# Altium footprint library ICs And Semiconductors SMD.PcbLib: 602 footprints (part 9 of 38)
Each footprint in its own frame and in the unit in brackets; x right, y up, seen from the top. Pads: shape width x height; smd on the part's side, far side on the other; paste and mask are expansions set on the pad; w line width, h text height; cw(c..) or ccw(c..) is an arc to the next point about the centre after c.
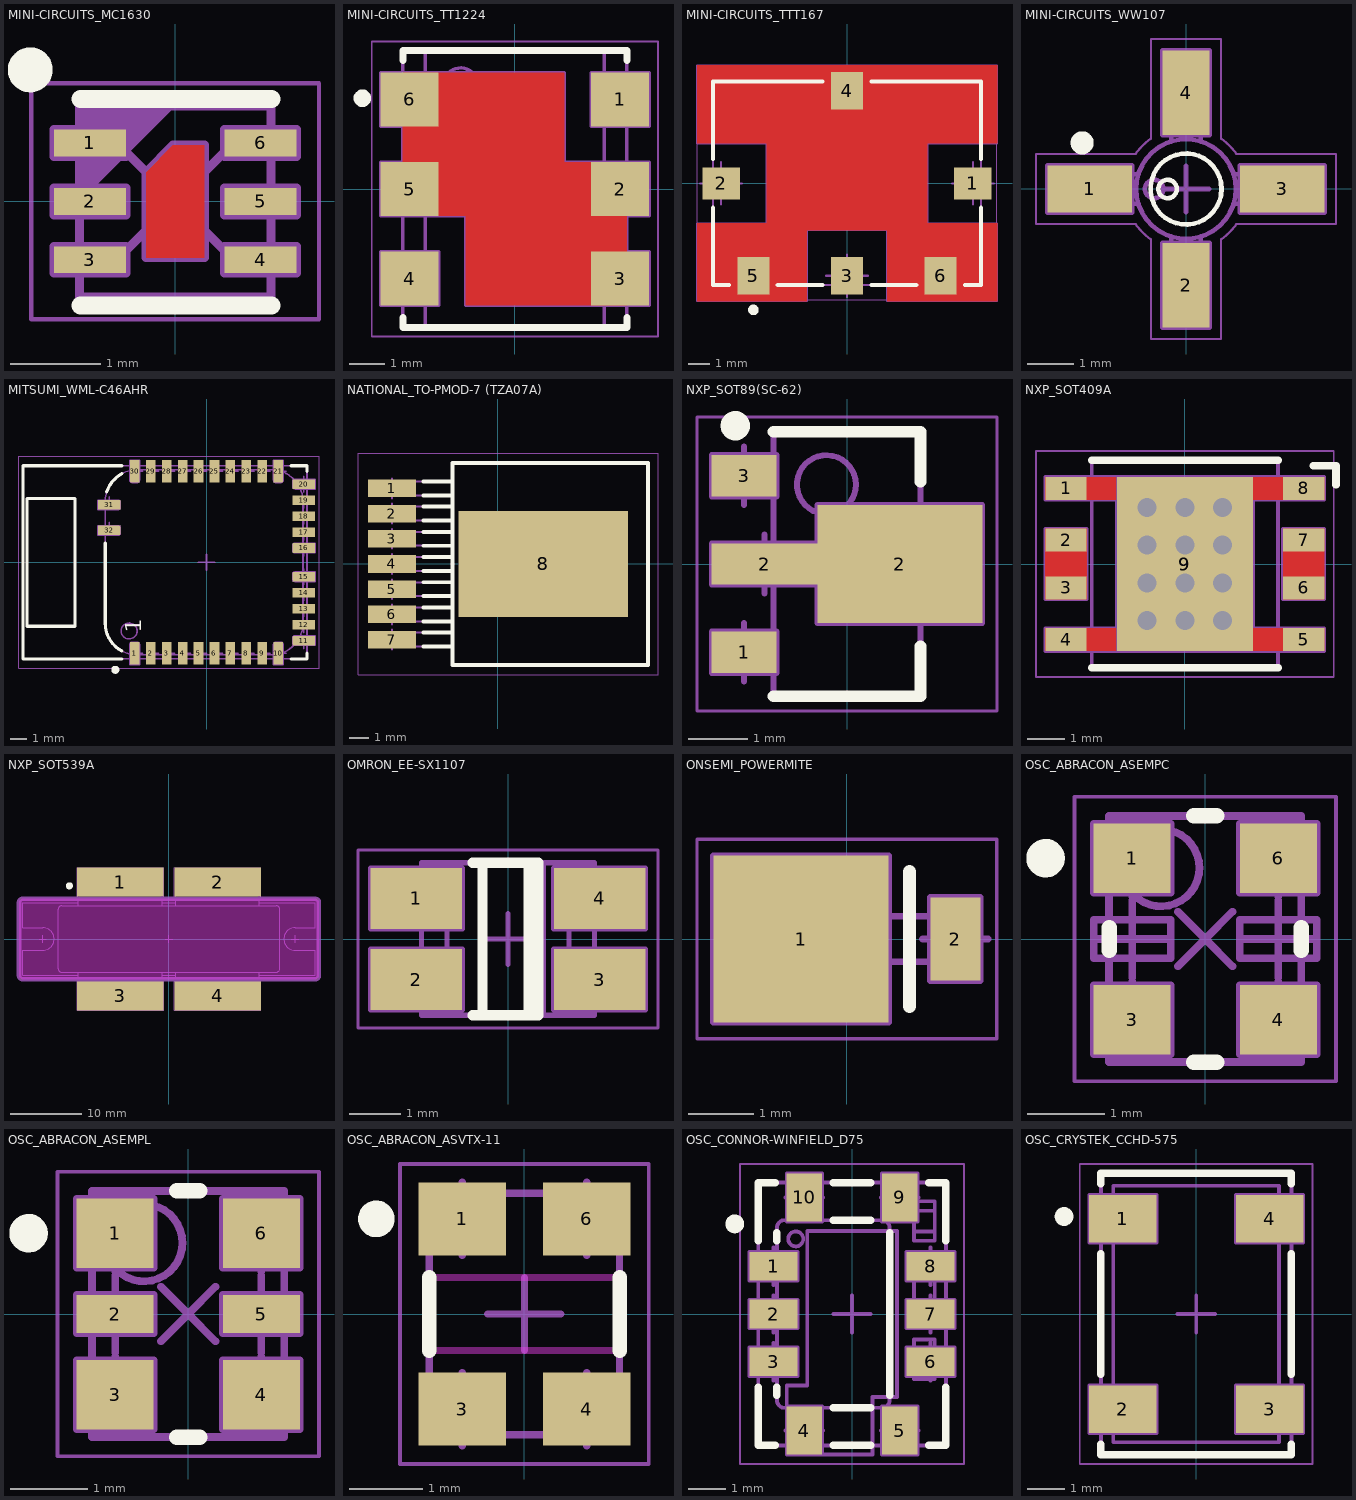
[diagram p8: the footprints below, top view; thin cyan lines are the x and y axes]

## MINI-CIRCUITS_MC1630 [mm] "MINI-CIRCUITS MC1630 Case, 0.65mm pitch, 6 pin, 2mm X 2mm X 0.85mm H body (w/thermal tab 0.65 X 1.25mm)"
height 0.85
pads (6):
  rect 0.8x0.3 smd: 1(-0.95,0.65) 2(-0.95,0) 3(-0.95,-0.65) 4(0.95,-0.65) 5(0.95,0) 6(0.95,0.65)
Top Layer:
  region: -0.325,-0.625 0.325,-0.625 0.325,0.625 -0.025,0.625 -0.325,0.325
Top Overlay:
  circle w0.25: c-1.613,1.463 r0.125
  lines w0.2: -1.054,-1.16 1.074,-1.16 ; -1.054,1.139 1.074,1.139
Mechanical 8:
  lines w0.1: -0.707,-0.707 0,0 ; -0.707,0.707 0,0 ; 0.707,-0.707 0,0 ; 0.707,0.707 0,0 ; -1.35,-0.8 -0.95,-0.65 -1.35,-0.5 ; -1.35,-0.8 -0.55,-0.8 -0.55,-0.5 -1.35,-0.5 ; -1.35,-0.8 -1.35,-0.5 ; -1.35,-0.15 -0.95,0 -1.35,0.15 ; -1.35,-0.15 -0.55,-0.15 -0.55,0.15 -1.35,0.15 ; -1.35,-0.15 -1.35,0.15 ; -1.35,0.5 -0.95,0.65 -1.35,0.8 ; -1.35,0.5 -0.55,0.5 -0.55,0.8 -1.35,0.8 ; -1.35,0.5 -1.35,0.8 ; 1.35,-0.8 0.95,-0.65 1.35,-0.5 ; 1.35,-0.8 0.55,-0.8 0.55,-0.5 1.35,-0.5 ; 1.35,-0.8 1.35,-0.5 ; 1.35,-0.15 0.95,0 1.35,0.15 ; 1.35,-0.15 0.55,-0.15 0.55,0.15 1.35,0.15 ; 1.35,-0.15 1.35,0.15 ; 1.35,0.5 0.95,0.65 1.35,0.8 ; 1.35,0.5 0.55,0.5 0.55,0.8 1.35,0.8 ; 1.35,0.5 1.35,0.8 ; -0.325,-0.625 -0.325,0.325 -0.025,0.625 0.325,0.625 0.325,-0.625 -0.325,-0.625
Mechanical 14:
  lines w0.1: -1.064,0.064 -0.064,1.064 ; -1.064,0.163 -0.163,1.064 ; -1.064,0.263 -0.263,1.064 ; -1.064,0.363 -0.363,1.064 ; -1.064,0.463 -0.463,1.064 ; -1.064,0.563 -0.564,1.064 ; -1.064,0.663 -0.664,1.064 ; -1.064,0.764 -0.764,1.064 ; -1.064,0.864 -0.864,1.064 ; -1.064,0.964 -0.964,1.064 ; -1.064,-1.064 -1.064,1.064 1.064,1.064 1.064,-1.064 -1.064,-1.064
Mechanical 15:
  lines w0.05: -1.6,-1.314 -1.6,1.314 1.6,1.314 1.6,-1.314 -1.6,-1.314
3D body "MINI-CIRCUITS_MC1630.stp": height 0.85, standoff 0, extent -1.063,-1.063 1.064,1.064

## MINI-CIRCUITS_TT1224 [mm] "MINI-CIRCUITS TT1224 Case, 6 pin, 6.35mm W X 7.87mm L"
height 4.06
pads (6):
  rect 1.65x1.52 smd: 1(2.985,2.54) 2(2.985,0) 3(2.985,-2.54) 4(-2.985,-2.54) 5(-2.985,0) 6(-2.985,2.54)
Top Layer:
  region: -3.175,-0.76 -1.395,-0.76 -1.395,-3.3 3.175,-3.3 3.175,0.76 1.395,0.76 1.395,3.3 -3.175,3.3
Top Overlay:
  circle w0.25: c-4.325,2.575 r0.125
  lines w0.2: -3.175,-3.65 -3.175,-3.935 3.175,-3.935 3.175,-3.65 ; -3.175,3.65 -3.175,3.935 3.175,3.935 3.175,3.65
Mechanical 8:
  lines w0.1: -3.485,-2.54 -2.985,-2.54 ; -3.485,0 -2.985,0 ; -3.485,2.54 -2.985,2.54 ; -2.985,-3.04 -2.985,-2.54 ; -2.985,-2.04 -2.985,-2.54 ; -2.985,-0.5 -2.985,0 ; -2.985,0.5 -2.985,0 ; -2.985,2.04 -2.985,2.54 ; -2.985,3.04 -2.985,2.54 ; -2.485,-2.54 -2.985,-2.54 ; -2.485,0 -2.985,0 ; -2.485,2.54 -2.985,2.54 ; -0.5,0 0,0 ; 0,-0.5 0,0 ; 0,0.5 0,0 ; 0.5,0 0,0 ; 2.485,-2.54 2.985,-2.54 ; 2.485,0 2.985,0 ; 2.485,2.54 2.985,2.54 ; 2.985,-3.04 2.985,-2.54 ; 2.985,-2.04 2.985,-2.54 ; 2.985,-0.5 2.985,0 ; 2.985,0.5 2.985,0 ; 2.985,2.04 2.985,2.54 ; 2.985,3.04 2.985,2.54 ; 3.485,-2.54 2.985,-2.54 ; 3.485,0 2.985,0 ; 3.485,2.54 2.985,2.54 ; -3.81,-3.3 -2.16,-3.3 -2.16,-1.78 -3.81,-1.78 -3.81,-3.3 ; -3.81,-0.76 -2.16,-0.76 -2.16,0.76 -3.81,0.76 -3.81,-0.76 ; -3.81,1.78 -2.16,1.78 -2.16,3.3 -3.81,3.3 -3.81,1.78 ; -3.175,-0.76 -3.175,3.3 1.395,3.3 1.395,0.76 3.175,0.76 3.175,-3.3 -1.395,-3.3 -1.395,-0.76 -3.175,-0.76 ; 2.16,-3.3 3.81,-3.3 3.81,-1.78 2.16,-1.78 2.16,-3.3 ; 2.16,-0.76 3.81,-0.76 3.81,0.76 2.16,0.76 2.16,-0.76 ; 2.16,1.78 3.81,1.78 3.81,3.3 2.16,3.3 2.16,1.78
Mechanical 14:
  circle w0.1: c-1.54,2.935 r0.5
  lines w0.1: -2.54,-3.935 -2.54,3.935 ; 2.54,-3.935 2.54,3.935 ; -3.175,-3.935 3.175,-3.935 3.175,-3.09 cw(c3.175,-2.54) 3.175,-1.99 3.175,-0.55 cw(c3.175,0) 3.175,0.55 3.175,1.99 cw(c3.175,2.54) 3.175,3.09 3.175,3.935 -3.175,3.935 -3.175,3.09 cw(c-3.175,2.54) -3.175,1.99 -3.175,0.55 cw(c-3.175,0) -3.175,-0.55 -3.175,-1.99 cw(c-3.175,-2.54) -3.175,-3.09 -3.175,-3.935
Mechanical 15:
  lines w0.05: -4.06,-4.185 -4.06,4.185 4.06,4.185 4.06,-4.185 -4.06,-4.185
3D body "MINI-CIRCUITS_TT1224.stp": height 4.11, standoff 0, extent -3.175,-3.935 3.175,3.935

## MINI-CIRCUITS_TTT167 [mm] "MINI-CIRCUITS TTT167 Case, 6 pin, 9.65mm W X 12.7mm L"
height 5.84
pads (6):
  rect 1.78x1.52 smd: 1(5.97,0) 2(-5.97,0)
  rect 1.52x1.78 smd: 3(0,-4.38) 4(0,4.38) 5(-4.44,-4.38) 6(4.44,-4.38)
Top Layer:
  region: -7.112,-1.903 -3.81,-1.903 -3.81,1.903 -7.112,1.903 -7.112,5.588 7.112,5.588 7.112,1.903 3.81,1.903 3.81,-1.903 7.112,-1.903 7.112,-5.588 1.903,-5.588 1.903,-2.22 -1.903,-2.22 -1.903,-5.588 -7.112,-5.588
Top Overlay:
  circle w0.25: c-4.44,-6 r0.125
  lines w0.2: -6.35,-1.16 -6.35,-4.825 -5.6,-4.825 ; -6.35,1.16 -6.35,4.825 -1.16,4.825 ; -3.28,-4.825 -1.16,-4.825 ; 1.16,-4.825 3.28,-4.825 ; 1.16,4.825 6.35,4.825 6.35,1.16 ; 5.6,-4.825 6.35,-4.825 6.35,-1.16
Mechanical 8:
  lines w0.1: -6.97,0 -5.97,0 ; -5.97,-1 -5.97,0 ; -5.97,1 -5.97,0 ; -5.44,-4.38 -4.44,-4.38 ; -4.97,0 -5.97,0 ; -4.44,-5.38 -4.44,-4.38 ; -4.44,-3.38 -4.44,-4.38 ; -3.44,-4.38 -4.44,-4.38 ; -1,-4.38 0,-4.38 ; -1,0 0,0 ; -1,4.38 0,4.38 ; 0,-5.38 0,-4.38 ; 0,-3.38 0,-4.38 ; 0,-1 0,0 ; 0,1 0,0 ; 0,3.38 0,4.38 ; 0,5.38 0,4.38 ; 1,-4.38 0,-4.38 ; 1,0 0,0 ; 1,4.38 0,4.38 ; 3.44,-4.38 4.44,-4.38 ; 4.44,-5.38 4.44,-4.38 ; 4.44,-3.38 4.44,-4.38 ; 4.97,0 5.97,0 ; 5.44,-4.38 4.44,-4.38 ; 5.97,-1 5.97,0 ; 5.97,1 5.97,0 ; 6.97,0 5.97,0 ; -7.112,-5.588 -1.903,-5.588 -1.903,-2.22 1.903,-2.22 1.903,-5.588 7.112,-5.588 7.112,-1.903 3.81,-1.903 3.81,1.903 7.112,1.903 7.112,5.588 -7.112,5.588 -7.112,1.903 -3.81,1.903 -3.81,-1.903 -7.112,-1.903 -7.112,-5.588
Mechanical 14:
  circle w0.1: c-4.44,-3 r0.4
  lines w0.1: -6.35,-4.825 -4.99,-4.825 cw(c-4.44,-4.825) -3.89,-4.825 -0.55,-4.825 cw(c0,-4.825) 0.55,-4.825 3.89,-4.825 cw(c4.44,-4.825) 4.99,-4.825 6.35,-4.825 6.35,-0.55 cw(c6.35,0) 6.35,0.55 6.35,4.825 0.55,4.825 cw(c0,4.825) -0.55,4.825 -6.35,4.825 -6.35,0.55 cw(c-6.35,0) -6.35,-0.55 -6.35,-4.825
Mechanical 15:
  lines w0.05: -7.11,-5.52 7.11,-5.52 7.11,5.52 -7.11,5.52 -7.11,-5.52
3D body "MINI-CIRCUITS_TTT167.stp": height 5.84, standoff 0, extent -6.35,-4.825 6.35,4.825

## MINI-CIRCUITS_WW107 [mm] "MINI-CIRCUITS WW107 Case"
height 1.52
pads (4):
  rect 1.83x1.02 smd: 1(-2.085,0) 3(2.085,0)
  rect 1.02x1.83 smd: 2(0,-2.085) 4(0,2.085)
Top Overlay:
  circle w0.25: c-2.25,1 r0.125
  circle w0.1: c0,0 r0.77
  circle w0.1: c-0.4,0 r0.2
Mechanical 8:
  lines w0.1: -2.585,0 -2.085,0 ; -2.085,-0.5 -2.085,0 ; -2.085,0.5 -2.085,0 ; -1.585,0 -2.085,0 ; -0.5,-2.085 0,-2.085 ; -0.5,0 0,0 ; -0.5,2.085 0,2.085 ; 0,-2.585 0,-2.085 ; 0,-1.585 0,-2.085 ; 0,-0.5 0,0 ; 0,0.5 0,0 ; 0,1.585 0,2.085 ; 0,2.585 0,2.085 ; 0.5,-2.085 0,-2.085 ; 0.5,0 0,0 ; 0.5,2.085 0,2.085 ; 1.585,0 2.085,0 ; 2.085,-0.5 2.085,0 ; 2.085,0.5 2.085,0 ; 2.585,0 2.085,0 ; -3,-0.51 -1.17,-0.51 -1.17,0.51 -3,0.51 -3,-0.51 ; -0.51,-3 0.51,-3 0.51,-1.17 -0.51,-1.17 -0.51,-3 ; -0.51,1.17 0.51,1.17 0.51,3 -0.51,3 -0.51,1.17 ; 1.17,-0.51 3,-0.51 3,0.51 1.17,0.51 1.17,-0.51
Mechanical 14:
  circle w0.1: c-0.691,0 r0.2
  circle w0.1: c0,0 r1.08
  lines w0.1: -1.029,-0.318 -2.84,-0.318 -2.84,-0.182 -2.34,0.318 -1.029,0.318 ; -0.318,-1.029 -0.318,-2.54 0.318,-2.54 0.318,-1.029 ; -0.318,1.029 -0.318,2.54 0.318,2.54 0.318,1.029 ; 1.029,-0.318 2.54,-0.318 2.54,0.318 1.029,0.318
Mechanical 15:
  lines w0.05: -3.25,-0.76 -3.25,0.76 -1.091,0.76 cw(c0,0) -0.76,1.091 -0.76,3.25 0.76,3.25 0.76,1.091 cw(c0,0) 1.091,0.76 3.25,0.76 3.25,-0.76 1.091,-0.76 cw(c0,0) 0.76,-1.092 0.76,-3.25 -0.76,-3.25 -0.76,-1.092 cw(c0,0) -1.091,-0.76 -3.25,-0.76
3D body "MINI-CIRCUITS_WW107.stp": height 1.52, standoff 0, extent -2.84,-2.54 2.54,2.54

## MITSUMI_WML-C46AHR [mm] "QFP,0.80mm Pitch, Square; 32 Pin, 7.00mm L X 7.00mm W X 1.60mm H Body, IPC Medium Density"
height 1.6
pads (32):
  rect 0.6x1.4 smd: 1(-4.5,-5.7) 2(-3.5,-5.7) 3(-2.5,-5.7) 4(-1.5,-5.7) 5(-0.5,-5.7) 6(0.5,-5.7) 7(1.5,-5.7) 8(2.5,-5.7) 9(3.5,-5.7) 10(4.5,-5.7) 21(4.5,5.7) 22(3.5,5.7) 23(2.5,5.7) 24(1.5,5.7) 25(0.5,5.7) 26(-0.5,5.7) 27(-1.5,5.7) 28(-2.5,5.7) 29(-3.5,5.7) 30(-4.5,5.7)
  rect 1.4x0.6 smd: 11(6.1,-4.9) 12(6.1,-3.9) 13(6.1,-2.9) 14(6.1,-1.9) 15(6.1,-0.9) 16(6.1,0.9) 17(6.1,1.9) 18(6.1,2.9) 19(6.1,3.9) 20(6.1,4.9) 31(-6.1,3.6) 32(-6.1,2)
Top Overlay:
  circle w0.25: c-5.715,-6.731 r0.125
  lines w0.2: -6.35,1.2 -6.35,-3.8 ccw(c-4.35,-3.8) -5.3,-5.56 ; -6.258,4.4 cw(c-4.35,3.8) -5.3,5.56 ; -5.3,-6.05 -11.5,-6.05 -11.5,6.05 -5.3,6.05 ; 5.3,-6.05 6.3,-6.05 6.3,-5.7 ; 5.3,6.05 6.3,6.05 6.3,5.7 ; -11.25,-4 -11.25,4 -8.25,4 -8.25,-4 -11.25,-4
  text "1" at -4.075,-4.425 h1
Mechanical 8:
  drawing of 162 lines, arcs and shapes, not listed
  text "16" at 4.445,0.635 h0.5
  text "15" at 4.445,-1.143 h0.5
  text "32" at -5.08,1.778 h0.5
  text "31" at -5.08,3.302 h0.5
  text "21" at 4.191,4.318 h0.5
  text "30" at -4.826,4.191 h0.5
  text "10" at 4.699,-4.699 h0.5
Mechanical 14:
  circle w0.1: c-4.85,-4.3 r0.5
  lines w0.1: -11.5,-6.05 6.3,-6.05 6.3,6.05 -11.5,6.05 -11.5,-6.05 ; -11.25,-4 -11.25,4 -8.25,4 -8.25,-4 -11.25,-4 ; -6.35,-3.8 ccw(c-4.35,-3.8) -4.35,-5.8 4.05,-5.8 ccw(c4.05,-3.8) 6.05,-3.8 6.05,3.8 ccw(c4.05,3.8) 4.05,5.8 -4.35,5.8 ccw(c-4.35,3.8) -6.35,3.8 -6.35,-3.8
Mechanical 15:
  lines w0.05: -11.75,-6.65 7.05,-6.65 7.05,6.65 -11.75,6.65 -11.75,-6.65
3D body "MITSUMI_WML-C46AHR.stp": height 2, standoff 0, extent -11.5,-6.05 6.3,6.05

## NATIONAL_TO-PMOD-7 (TZA07A) [mm] "TO-PMOD 7 Pin Package, NATIONAL Package TZA07A, 1.70mm pitch; 9.85mm L X 10.16mm W X 4.67mm H body"
height 4.67
pads (8):
  rect 2.41x0.89 smd: 1(-5.339,3.81) 2(-5.339,2.54) 3(-5.339,1.27) 4(-5.339,0) 5(-5.339,-1.27) 6(-5.339,-2.54) 7(-5.339,-3.81)
  rect 8.54x5.35 smd: 8(2.291,0)
Top Overlay:
  lines w0.2: -3.734,-4.16 -2.279,-4.16 ; -3.734,-3.46 -2.279,-3.46 ; -3.734,-2.89 -2.279,-2.89 ; -3.734,-2.19 -2.279,-2.19 ; -3.734,-1.62 -2.279,-1.62 ; -3.734,-0.92 -2.279,-0.92 ; -3.734,-0.35 -2.279,-0.35 ; -3.734,0.35 -2.279,0.35 ; -3.734,0.92 -2.279,0.92 ; -3.734,1.62 -2.279,1.62 ; -3.734,2.19 -2.279,2.19 ; -3.734,2.89 -2.279,2.89 ; -3.734,3.46 -2.279,3.46 ; -3.734,4.16 -2.279,4.16 ; -2.279,-5.08 7.571,-5.08 7.571,5.08 -2.279,5.08 -2.279,-5.08
Mechanical 8:
  lines w0.1: -5.839,-3.81 -5.339,-3.81 ; -5.839,-2.54 -5.339,-2.54 ; -5.839,-1.27 -5.339,-1.27 ; -5.839,0 -5.339,0 ; -5.839,1.27 -5.339,1.27 ; -5.839,2.54 -5.339,2.54 ; -5.839,3.81 -5.339,3.81 ; -5.339,-4.31 -5.339,-3.81 ; -5.339,-3.31 -5.339,-3.81 ; -5.339,-3.04 -5.339,-2.54 ; -5.339,-2.04 -5.339,-2.54 ; -5.339,-1.77 -5.339,-1.27 ; -5.339,-0.77 -5.339,-1.27 ; -5.339,-0.5 -5.339,0 ; -5.339,0.5 -5.339,0 ; -5.339,0.77 -5.339,1.27 ; -5.339,1.77 -5.339,1.27 ; -5.339,2.04 -5.339,2.54 ; -5.339,3.04 -5.339,2.54 ; -5.339,3.31 -5.339,3.81 ; -5.339,4.31 -5.339,3.81 ; -4.839,-3.81 -5.339,-3.81 ; -4.839,-2.54 -5.339,-2.54 ; -4.839,-1.27 -5.339,-1.27 ; -4.839,0 -5.339,0 ; -4.839,1.27 -5.339,1.27 ; -4.839,2.54 -5.339,2.54 ; -4.839,3.81 -5.339,3.81 ; 1.791,0 2.291,0 ; 2.291,-0.5 2.291,0 ; 2.291,0.5 2.291,0 ; 2.791,0 2.291,0
Mechanical 14:
  lines w0.1: -2.279,-4.16 -6.199,-4.16 -6.199,-3.46 -2.279,-3.46 ; -2.279,-2.89 -6.199,-2.89 -6.199,-2.19 -2.279,-2.19 ; -2.279,-1.62 -6.199,-1.62 -6.199,-0.92 -2.279,-0.92 ; -2.279,-0.35 -6.199,-0.35 -6.199,0.35 -2.279,0.35 ; -2.279,0.92 -6.199,0.92 -6.199,1.62 -2.279,1.62 ; -2.279,2.19 -6.199,2.19 -6.199,2.89 -2.279,2.89 ; -2.279,3.46 -6.199,3.46 -6.199,4.16 -2.279,4.16 ; -2.279,-5.08 7.571,-5.08 7.571,5.08 -2.279,5.08 -2.279,-5.08
Mechanical 15:
  lines w0.05: -0.5,0 0,0 ; 0,-0.5 0,0 ; 0,0.5 0,0 ; 0.5,0 0,0 ; -7.044,-5.58 8.071,-5.58 8.071,5.58 -7.044,5.58 -7.044,-5.58
3D body "NATIONAL_TO-PMOD-7 (TZA07A).stp": height 4.77, standoff 0, extent -6.199,-5.08 7.571,5.08

## NXP_SOT89(SC-62) [mm] "SOT89, (SC-62), TO-243, 3-Leads, Body 2.5x4.5mm"
height 1.2
pads (4):
  rect 1.1x0.7 smd: 1(-1.75,-1.5) 3(-1.75,1.5)
  rect 1.8x0.7 smd: 2(-1.4,0)
  rect 2.8x2 smd: 2(0.9,0)
Top Overlay:
  circle w0.25: c-1.9,2.35 r0.125
  lines w0.2: -1.25,-2.25 1.25,-2.25 1.25,-1.4 ; -1.25,2.25 1.25,2.25 1.25,1.4
Mechanical 8:
  lines w0.1: -2.25,-1.5 -1.75,-1.5 ; -2.25,1.5 -1.75,1.5 ; -1.9,0 -1.4,0 ; -1.75,-2 -1.75,-1.5 ; -1.75,-1 -1.75,-1.5 ; -1.75,1 -1.75,1.5 ; -1.75,2 -1.75,1.5 ; -1.4,-0.5 -1.4,0 ; -1.4,0.5 -1.4,0 ; -1.25,-1.5 -1.75,-1.5 ; -1.25,1.5 -1.75,1.5 ; -0.9,0 -1.4,0 ; -0.5,0 0,0 ; 0,-0.5 0,0 ; 0,0.5 0,0 ; 0.4,0 0.9,0 ; 0.5,0 0,0 ; 0.9,-0.5 0.9,0 ; 0.9,0.5 0.9,0 ; 1.4,0 0.9,0 ; -2.3,-1.85 -1.2,-1.85 -1.2,-1.15 -2.3,-1.15 -2.3,-1.85 ; -2.3,-0.35 -0.5,-0.35 -0.5,-1 2.3,-1 2.3,1 -0.5,1 -0.5,0.35 -2.3,0.35 -2.3,-0.35 ; -2.3,1.15 -1.2,1.15 -1.2,1.85 -2.3,1.85 -2.3,1.15
Mechanical 14:
  circle w0.1: c-0.35,1.35 r0.5
  lines w0.1: -1.25,-1.707 -1.25,-1.293 ; -1.25,1.293 -1.25,1.707 ; -1.25,-2.25 -1.25,2.25 1.25,2.25 1.25,-2.25 -1.25,-2.25
Mechanical 15:
  lines w0.05: -2.55,-2.5 -2.55,2.5 2.55,2.5 2.55,-2.5 -2.55,-2.5
3D body "NXP_SOT89(SC-62).stp": height 1.6, standoff 0, extent -2.25,-2.25 2.25,2.25

## NXP_SOT409A [mm] "SOT409A, 1.27mm pitch; 8 pin, 4.47mm W X 5.485mm L X 2.36mm H body (w/thermal tab 3.6mm X 4.6mm)"
height 2.36
pads (10):
  rect 1.09x0.6 smd: 1(-3.145,2) 2(-3.145,0.635) 3(-3.145,-0.635) 4(-3.145,-2) 5(3.145,-2) 6(3.145,-0.635) 7(3.145,0.635) 8(3.145,2)
  rect 3.6x4.6 smd: 9(0,0)
  rect 3.6x4.6 smd far side paste-3.61: 9(0,0)
via -1,1.5 diameter 0.8 hole 0.5
via 0,1.5 diameter 0.8 hole 0.5
via 1,1.5 diameter 0.8 hole 0.5
via 1,0.5 diameter 0.8 hole 0.5
via 0,0.5 diameter 0.8 hole 0.5
via -1,0.5 diameter 0.8 hole 0.5
via -1,-0.5 diameter 0.8 hole 0.5
via 0,-0.5 diameter 0.8 hole 0.5
via 1,-0.5 diameter 0.8 hole 0.5
via -1,-1.5 diameter 0.8 hole 0.5
via 0,-1.5 diameter 0.8 hole 0.5
via 1,-1.5 diameter 0.8 hole 0.5
Top Layer:
  region: -3.69,-2.3 -3.69,-1.7 -1.8,-1.7 -1.8,1.7 -3.69,1.7 -3.69,2.3 3.69,2.3 3.69,1.7 1.8,1.7 1.8,-1.7 3.69,-1.7 3.69,-2.3
  region: -3.69,0.935 -2.6,0.935 -2.6,-0.935 -3.69,-0.935
  region: 2.6,0.935 3.69,0.935 3.69,-0.935 2.6,-0.935
Top Overlay:
  lines w0.2: -2.465,-2.743 2.465,-2.743 ; -2.465,2.743 2.465,2.743 ; 3.4,2.6 4,2.6 4,2.1
Top Paste:
  region: -1.06,-1.81 1.06,-1.81 1.06,-0.25 -1.06,-0.25
  region: -1.06,0.25 1.06,0.25 1.06,1.81 -1.06,1.81
Mechanical 8:
  lines w0.1: -3.445,-2 -3.145,-2 ; -3.445,-0.635 -3.145,-0.635 ; -3.445,0.635 -3.145,0.635 ; -3.445,2 -3.145,2 ; -3.145,-2.3 -3.145,-2 ; -3.145,-1.7 -3.145,-2 ; -3.145,-0.935 -3.145,-0.635 ; -3.145,-0.335 -3.145,-0.635 ; -3.145,0.335 -3.145,0.635 ; -3.145,0.935 -3.145,0.635 ; -3.145,1.7 -3.145,2 ; -3.145,2.3 -3.145,2 ; -2.845,-2 -3.145,-2 ; -2.845,-0.635 -3.145,-0.635 ; -2.845,0.635 -3.145,0.635 ; -2.845,2 -3.145,2 ; -1.3,-1.5 -1,-1.5 ; -1.3,-0.5 -1,-0.5 ; -1.3,0.5 -1,0.5 ; -1.3,1.5 -1,1.5 ; -1,-1.8 -1,-1.5 ; -1,-1.2 -1,-1.5 ; -1,-0.8 -1,-0.5 ; -1,-0.2 -1,-0.5 ; -1,0.2 -1,0.5 ; -1,0.8 -1,0.5 ; -1,1.2 -1,1.5 ; -1,1.8 -1,1.5 ; -0.7,-1.5 -1,-1.5 ; -0.7,-0.5 -1,-0.5 ; -0.7,0.5 -1,0.5 ; -0.7,1.5 -1,1.5 ; -0.3,-1.5 0,-1.5 ; -0.3,-0.5 0,-0.5 ; -0.3,0 0,0 ; -0.3,0.5 0,0.5 ; -0.3,1.5 0,1.5 ; 0,-1.8 0,-1.5 ; 0,-1.2 0,-1.5 ; 0,-0.8 0,-0.5 ; 0,-0.3 0,0 ; 0,-0.2 0,-0.5 ; 0,0.2 0,0.5 ; 0,0.3 0,0 ; 0,0.8 0,0.5 ; 0,1.2 0,1.5 ; 0,1.8 0,1.5 ; 0.3,-1.5 0,-1.5 ; 0.3,-0.5 0,-0.5 ; 0.3,0 0,0 ; 0.3,0.5 0,0.5 ; 0.3,1.5 0,1.5 ; 0.7,-1.5 1,-1.5 ; 0.7,-0.5 1,-0.5 ; 0.7,0.5 1,0.5 ; 0.7,1.5 1,1.5 ; 1,-1.8 1,-1.5 ; 1,-1.2 1,-1.5 ; 1,-0.8 1,-0.5 ; 1,-0.2 1,-0.5 ; 1,0.2 1,0.5 ; 1,0.8 1,0.5 ; 1,1.2 1,1.5 ; 1,1.8 1,1.5 ; 1.3,-1.5 1,-1.5 ; 1.3,-0.5 1,-0.5 ; 1.3,0.5 1,0.5 ; 1.3,1.5 1,1.5 ; 2.845,-2 3.145,-2 ; 2.845,-0.635 3.145,-0.635 ; 2.845,0.635 3.145,0.635 ; 2.845,2 3.145,2 ; 3.145,-2.3 3.145,-2 ; 3.145,-1.7 3.145,-2 ; 3.145,-0.935 3.145,-0.635 ; 3.145,-0.335 3.145,-0.635 ; 3.145,0.335 3.145,0.635 ; 3.145,0.935 3.145,0.635 ; 3.145,1.7 3.145,2 ; 3.145,2.3 3.145,2 ; 3.445,-2 3.145,-2 ; 3.445,-0.635 3.145,-0.635 ; 3.445,0.635 3.145,0.635 ; 3.445,2 3.145,2 ; -3.69,-2.3 -3.69,-1.7 -1.8,-1.7 -1.8,1.7 -3.69,1.7 -3.69,2.3 3.69,2.3 3.69,1.7 1.8,1.7 1.8,-1.7 3.69,-1.7 3.69,-2.3 -3.69,-2.3 ; -3.69,-0.935 -2.6,-0.935 -2.6,0.935 -3.69,0.935 -3.69,-0.935 ; 2.6,-0.935 3.69,-0.935 3.69,0.935 2.6,0.935 2.6,-0.935
Mechanical 14:
  lines w0.1: 3.381,2.3 3.69,1.991 ; 3.523,2.3 3.69,2.133 ; 3.664,2.3 3.69,2.274 ; -2.465,-2.743 -2.465,2.743 2.465,2.743 2.465,-2.743 -2.465,-2.743 ; 3.24,2.3 3.69,2.3 3.69,1.85 3.24,2.3
Mechanical 15:
  circle w0.05: c0,0 r0.35
  lines w0.05: -0.5,0 0.5,0 ; 0,-0.5 0,0.5 ; -3.94,-2.993 3.94,-2.993 3.94,2.993 -3.94,2.993 -3.94,-2.993
Drill Drawing:
  lines w0.1: -1.8,-2.3 1.8,-2.3 1.8,2.3 -1.8,2.3 -1.8,-2.3
  text "Filled and" at -3.075,-2.725 h0.6
  text "Capped Via" at -2.1,-2.725 h0.6
3D body "NXP_SOT409A.stp": height 2.36, standoff 0, extent -3.682,-2.742 3.683,2.743

## NXP_SOT539A [mm] "SOT539A Flanged balanced LDMOST ceramic package; 2 mounting holes; 4 leads"
height 5.33
pads (4):
  rect 12.2x4.1 smd: 1(-6.86,8.018) 2(6.86,8.018) 3(-6.86,-8.018) 4(6.86,-8.018)
Top Overlay:
  circle w0.5: c-14.05,7.5 r0.25
Keep-Out Layer:
  board cut-out: -20.64,-5.65 -20.74,-5.65 -20.923,-5.574 -21.064,-5.433 -21.14,-5.249 -21.14,-5.15 -21.14,5.15 -21.14,5.249 -21.064,5.433 -20.923,5.574 -20.74,5.65 -20.64,5.65 20.66,5.65 20.759,5.65 20.943,5.574 21.084,5.433 21.16,5.249 21.16,5.15 21.16,-5.15 21.16,-5.249 21.084,-5.433 20.943,-5.574 20.759,-5.65 20.66,-5.65
Mechanical 1:
  lines w0.635: -21.15,-5.15 ccw(c-20.65,-5.15) -20.65,-5.65 20.65,-5.65 ccw(c20.65,-5.15) 21.15,-5.15 21.15,5.15 ccw(c20.65,5.15) 20.65,5.65 -20.65,5.65 ccw(c-20.65,5.15) -21.15,5.15 -21.15,-5.15
Mechanical 8:
  lines w0.1: -18.28,0 -17.78,0 ; -17.78,-0.5 -17.78,0 ; -17.78,0.5 -17.78,0 ; -17.28,0 -17.78,0 ; -7.36,-8.018 -6.86,-8.018 ; -7.36,8.018 -6.86,8.018 ; -6.86,-8.518 -6.86,-8.018 ; -6.86,-7.518 -6.86,-8.018 ; -6.86,7.518 -6.86,8.018 ; -6.86,8.518 -6.86,8.018 ; -6.36,-8.018 -6.86,-8.018 ; -6.36,8.018 -6.86,8.018 ; -0.5,0 0,0 ; 0,-0.5 0,0 ; 0,0.5 0,0 ; 0.5,0 0,0 ; 6.36,-8.018 6.86,-8.018 ; 6.36,8.018 6.86,8.018 ; 6.86,-8.518 6.86,-8.018 ; 6.86,-7.518 6.86,-8.018 ; 6.86,7.518 6.86,8.018 ; 6.86,8.518 6.86,8.018 ; 7.36,-8.018 6.86,-8.018 ; 7.36,8.018 6.86,8.018 ; 17.28,0 17.78,0 ; 17.78,-0.5 17.78,0 ; 17.78,0.5 17.78,0 ; 18.28,0 17.78,0 ; -12.96,-10.068 -12.96,-5.968 -0.76,-5.968 -0.76,-10.068 -12.96,-10.068 ; -12.96,5.968 -0.76,5.968 -0.76,10.068 -12.96,10.068 -12.96,5.968 ; 0.76,-10.068 0.76,-5.968 12.96,-5.968 12.96,-10.068 0.76,-10.068 ; 0.76,5.968 12.96,5.968 12.96,10.068 0.76,10.068 0.76,5.968
Mechanical 14:
  lines w0.1: -12.765,-5.145 -20.64,-5.145 -20.64,-1.587 -17.78,-1.587 ccw(c-17.78,0) -17.78,1.587 -20.64,1.587 -20.64,5.145 -12.765,5.145 ; -0.955,-5.145 0.955,-5.145 ; -0.955,5.145 0.955,5.145 ; 12.765,-5.145 20.64,-5.145 20.64,-1.587 17.78,-1.587 cw(c17.78,0) 17.78,1.587 20.64,1.587 20.64,5.145 12.765,5.145 ; -15.623,-4.2 ccw(c-15.123,-4.2) -15.123,-4.7 15.123,-4.7 ccw(c15.123,-4.2) 15.623,-4.2 15.623,4.2 ccw(c15.123,4.2) 15.123,4.7 -15.123,4.7 ccw(c-15.123,4.2) -15.623,4.2 -15.623,-4.2 ; -12.765,-8.56 -12.765,-4.7 -0.955,-4.7 -0.955,-8.56 -12.765,-8.56 ; -12.765,4.7 -12.765,7.36 -11.565,8.56 -0.955,8.56 -0.955,4.7 -12.765,4.7 ; 0.955,-8.56 12.765,-8.56 12.765,-4.7 0.955,-4.7 0.955,-8.56 ; 0.955,4.7 12.765,4.7 12.765,8.56 2.155,8.56 0.955,7.36 0.955,4.7
Drill Drawing:
  lines w0.1: -20.21,2.598 -21.15,2.94 ; -20.21,3.282 -21.15,2.94 ; -18.772,-4.71 -18.43,-5.65 ; -18.772,4.71 -18.43,5.65 ; -18.088,-4.71 -18.43,-5.65 ; -18.088,4.71 -18.43,5.65 ; -0.5,0 0,0 ; 0,-0.5 0,0 ; 0,0.5 0,0 ; 0.5,0 0,0 ; 14.819,-4.052 19.552,-4.052 21.004,-5.504 ; 20.097,-5.081 21.004,-5.504 ; 20.21,2.598 21.15,2.94 ; 20.21,3.282 21.15,2.94 ; 20.581,-4.597 21.004,-5.504 ; -21.15,2.94 21.15,2.94 ; -18.43,-5.65 -18.43,5.65 ; -21.15,-5.15 ccw(c-20.65,-5.15) -20.65,-5.65 20.65,-5.65 ccw(c20.65,-5.15) 21.15,-5.15 21.15,5.15 ccw(c20.65,5.15) 20.65,5.65 -20.65,5.65 ccw(c-20.65,5.15) -21.15,5.15 -21.15,-5.15
  text "r0.5" at 14.748,-3.843 h1
  text "11.3" at -18.639,-1.021 h1
  text "42.3" at -4.271,3.149 h1
3D body "NXP_SOT539A.stp": height 3.03, standoff -2.3, extent -20.64,-8.56 20.64,8.56

## OMRON_EE-SX1107 [mm] "OMRON 3.4mm x 3mm x 3mm Photomicrosensor"
height 3.15
pads (4):
  rect 1.8x1.2 smd: 1(-1.8,0.8) 2(-1.8,-0.8) 3(1.8,-0.8) 4(1.8,0.8)
Top Overlay:
  lines w0.2: -0.7,-1.5 0.6,-1.5 0.6,1.5 -0.7,1.5 ; -0.5,-1.5 -0.5,1.5 ; 0.4,-1.5 0.4,1.5 ; 0.5,-1.5 0.5,1.5 0.5,-1.5
Mechanical 8:
  lines w0.1: -2.3,-0.8 -1.8,-0.8 ; -2.3,0.8 -1.8,0.8 ; -1.8,-1.3 -1.8,-0.8 ; -1.8,-0.3 -1.8,-0.8 ; -1.8,0.3 -1.8,0.8 ; -1.8,1.3 -1.8,0.8 ; -1.3,-0.8 -1.8,-0.8 ; -1.3,0.8 -1.8,0.8 ; -0.5,0 0,0 ; 0,-0.5 0,0 ; 0,0.5 0,0 ; 0.5,0 0,0 ; 1.3,-0.8 1.8,-0.8 ; 1.3,0.8 1.8,0.8 ; 1.8,-1.3 1.8,-0.8 ; 1.8,-0.3 1.8,-0.8 ; 1.8,0.3 1.8,0.8 ; 1.8,1.3 1.8,0.8 ; 2.3,-0.8 1.8,-0.8 ; 2.3,0.8 1.8,0.8 ; -2.7,-1.4 -2.7,-0.2 -0.9,-0.2 -0.9,-1.4 -2.7,-1.4 ; -2.7,0.2 -0.9,0.2 -0.9,1.4 -2.7,1.4 -2.7,0.2 ; 0.9,-1.4 2.7,-1.4 2.7,-0.2 0.9,-0.2 0.9,-1.4 ; 0.9,0.2 2.7,0.2 2.7,1.4 0.9,1.4 0.9,0.2
Mechanical 14:
  lines w0.1: -1.2,-1.5 -1.2,1.5 ; -0.5,-1.5 -0.5,1.5 ; 0.5,-1.5 0.5,1.5 ; 0.6,-1.5 0.6,1.5 ; 0.65,-1.5 0.65,1.5 ; 0.7,-1.5 0.7,1.5 ; 1.2,-1.5 1.2,1.5 ; -1.7,-1.5 -1.7,1.5 1.7,1.5 1.7,-1.5 -1.7,-1.5
  text "E" at 2,-1.2 h0.8
  text "C" at 2,0.4 h0.8
  text "K" at -2.5,-1.2 h0.8
  text "A" at -2.5,0.4 h0.8
Mechanical 15:
  lines w0.05: -2.95,-1.75 2.95,-1.75 2.95,1.75 -2.95,1.75 -2.95,-1.75
3D body "OMRON_EE-SX1107.stp": height 3, standoff 0, extent -1.7,-1.5 1.7,1.5

## ONSEMI_POWERMITE [mil] "ON SEMICONDUCTOR POWERMITE Case, 2-Leads, Body 1.965 x 1.9mm"
height 45.28
pads (2):
  rect 105.12x100 smd: 1(-27.5,0)
  rect 30x50 smd: 2(65.06,0)
Top Overlay:
  lines w7.87: 37.56,-40.35 37.56,40.35
Mechanical 8:
  lines w3.94: -47.19,0 -27.5,0 ; -27.5,-19.68 -27.5,0 ; -27.5,19.69 -27.5,0 ; -19.68,0 0,0 ; 0,-19.69 0,0 ; 0,19.69 0,0 ; 19.69,0 0,0 ; 45.37,0 65.06,0 ; 65.06,-19.69 65.06,0 ; 65.06,19.69 65.06,0 ; 84.74,0 65.06,0 ; -80.06,-50 25.06,-50 25.06,50 -80.06,50 -80.06,-50 ; 50.06,-25 50.06,25 80.06,25 80.06,-25 50.06,-25
Mechanical 14:
  lines w3.94: -43.31,-37.4 -43.31,37.4 ; -41.34,-37.4 -41.34,37.4 ; -37.4,-37.4 -37.4,37.4 ; -35.43,-37.4 -35.43,37.4 ; -31.5,-37.4 -31.5,37.4 ; 20.28,-13.58 76.77,-13.58 76.77,13.58 20.28,13.58 ; -76.77,-19.69 -76.77,19.69 -57.09,19.69 -57.09,-19.69 -76.77,-19.69 ; -57.09,-37.4 20.28,-37.4 20.28,37.4 -57.09,37.4 -57.09,-37.4
Mechanical 15:
  lines w1.97: -89.9,-59.84 89.9,-59.84 89.9,59.84 -89.9,59.84 -89.9,-59.84
3D body "ONSEMI_POWERMITE.stp": height 45.28, standoff 0, extent -76.78,-37.4 76.77,37.4

## OSC_ABRACON_ASEMPC [mm] "4 Pins, 3.2x2.5mm, Performance Plastic Package Ultra Miniature Pure Silicon Clock Oscillator, ASEMP Serie CMOS Version"
height 0.9
pads (4):
  rect 1x0.9 smd: 1(-0.95,1.05) 3(-0.95,-1.05) 4(0.95,-1.05) 6(0.95,1.05)
Top Overlay:
  circle w0.25: c-2.075,1.05 r0.125
  lines w0.2: -1.25,-0.15 -1.25,0.15 ; -0.15,-1.6 0.15,-1.6 ; -0.15,1.6 0.15,1.6 ; 1.25,-0.15 1.25,0.15
Mechanical 8:
  lines w0.1: -1.45,-1.05 -0.95,-1.05 ; -1.45,0 -0.95,0 ; -1.45,1.05 -0.95,1.05 ; -0.95,-1.55 -0.95,-1.05 ; -0.95,-0.55 -0.95,-1.05 ; -0.95,-0.5 -0.95,0 ; -0.95,0.5 -0.95,0 ; -0.95,0.55 -0.95,1.05 ; -0.95,1.55 -0.95,1.05 ; -0.45,-1.05 -0.95,-1.05 ; -0.45,0 -0.95,0 ; -0.45,1.05 -0.95,1.05 ; -0.354,-0.354 0,0 ; -0.354,0.354 0,0 ; 0.354,-0.354 0,0 ; 0.354,0.354 0,0 ; 0.45,-1.05 0.95,-1.05 ; 0.45,0 0.95,0 ; 0.45,1.05 0.95,1.05 ; 0.95,-1.55 0.95,-1.05 ; 0.95,-0.55 0.95,-1.05 ; 0.95,-0.5 0.95,0 ; 0.95,0.5 0.95,0 ; 0.95,0.55 0.95,1.05 ; 0.95,1.55 0.95,1.05 ; 1.45,-1.05 0.95,-1.05 ; 1.45,0 0.95,0 ; 1.45,1.05 0.95,1.05 ; -1.45,-1.5 -0.45,-1.5 -0.45,-0.6 -1.45,-0.6 -1.45,-1.5 ; -1.45,-0.25 -1.45,0.25 -0.45,0.25 -0.45,-0.25 -1.45,-0.25 ; -1.45,0.6 -0.45,0.6 -0.45,1.5 -1.45,1.5 -1.45,0.6 ; 0.45,-1.5 1.45,-1.5 1.45,-0.6 0.45,-0.6 0.45,-1.5 ; 0.45,-0.25 0.45,0.25 1.45,0.25 1.45,-0.25 0.45,-0.25 ; 0.45,0.6 1.45,0.6 1.45,1.5 0.45,1.5 0.45,0.6
Mechanical 14:
  circle w0.1: c-0.575,0.925 r0.5
  lines w0.1: -1.25,-1.6 1.25,-1.6 1.25,1.6 -1.25,1.6 -1.25,-1.6
Mechanical 15:
  lines w0.05: -1.7,-1.85 -1.7,1.85 1.7,1.85 1.7,-1.85 -1.7,-1.85
3D body "OSC_ABRACON_ASEMPC.stp": height 1, standoff 0, extent -1.25,-1.6 1.25,1.6

## OSC_ABRACON_ASEMPL [mm] "6 Pins, 3.2x2.5mm, Performance Plastic Package Ultra Miniature Pure Silicon Clock Oscillator ASEMP Serie"
height 0.9
pads (6):
  rect 1x0.9 smd: 1(-0.95,1.05) 3(-0.95,-1.05) 4(0.95,-1.05) 6(0.95,1.05)
  rect 1x0.5 smd: 2(-0.95,0) 5(0.95,0)
Top Overlay:
  circle w0.25: c-2.075,1.05 r0.125
  lines w0.2: -0.15,-1.6 0.15,-1.6 ; -0.15,1.6 0.15,1.6
Mechanical 8:
  lines w0.1: -1.45,-1.05 -0.95,-1.05 ; -1.45,0 -0.95,0 ; -1.45,1.05 -0.95,1.05 ; -0.95,-1.55 -0.95,-1.05 ; -0.95,-0.55 -0.95,-1.05 ; -0.95,-0.5 -0.95,0 ; -0.95,0.5 -0.95,0 ; -0.95,0.55 -0.95,1.05 ; -0.95,1.55 -0.95,1.05 ; -0.45,-1.05 -0.95,-1.05 ; -0.45,0 -0.95,0 ; -0.45,1.05 -0.95,1.05 ; -0.354,-0.354 0,0 ; -0.354,0.354 0,0 ; 0.354,-0.354 0,0 ; 0.354,0.354 0,0 ; 0.45,-1.05 0.95,-1.05 ; 0.45,0 0.95,0 ; 0.45,1.05 0.95,1.05 ; 0.95,-1.55 0.95,-1.05 ; 0.95,-0.55 0.95,-1.05 ; 0.95,-0.5 0.95,0 ; 0.95,0.5 0.95,0 ; 0.95,0.55 0.95,1.05 ; 0.95,1.55 0.95,1.05 ; 1.45,-1.05 0.95,-1.05 ; 1.45,0 0.95,0 ; 1.45,1.05 0.95,1.05 ; -1.45,-1.5 -0.45,-1.5 -0.45,-0.6 -1.45,-0.6 -1.45,-1.5 ; -1.45,-0.25 -1.45,0.25 -0.45,0.25 -0.45,-0.25 -1.45,-0.25 ; -1.45,0.6 -0.45,0.6 -0.45,1.5 -1.45,1.5 -1.45,0.6 ; 0.45,-1.5 1.45,-1.5 1.45,-0.6 0.45,-0.6 0.45,-1.5 ; 0.45,-0.25 0.45,0.25 1.45,0.25 1.45,-0.25 0.45,-0.25 ; 0.45,0.6 1.45,0.6 1.45,1.5 0.45,1.5 0.45,0.6
Mechanical 14:
  circle w0.1: c-0.575,0.925 r0.5
  lines w0.1: -1.25,-1.6 1.25,-1.6 1.25,1.6 -1.25,1.6 -1.25,-1.6
Mechanical 15:
  lines w0.05: -1.7,-1.85 -1.7,1.85 1.7,1.85 1.7,-1.85 -1.7,-1.85
3D body "OSC_ABRACON_ASEMPL.stp": height 1, standoff 0, extent -1.25,-1.6 1.25,1.6

## OSC_ABRACON_ASVTX-11 [mm] "Voltage Controlled Temperature Compensated Crystal Oscillator ASVTX-11  Serie, SMD Oscillator, 4 pins, 3.2x2.5mm"
height 1
pads (4):
  rect 1.2x1 smd: 1(-0.85,1.3) 3(-0.85,-1.3) 4(0.85,-1.3) 6(0.85,1.3)
Top Layer keep-out:
  lines w0.1: -1.3,-0.5 1.3,-0.5 1.3,0.5 -1.3,0.5 -1.3,-0.5
Top Overlay:
  circle w0.25: c-2.025,1.3 r0.125
  lines w0.2: -1.3,-0.5 -1.3,0.5 ; 1.3,-0.5 1.3,0.5
Mechanical 8:
  lines w0.1: -1.35,-1.3 -0.85,-1.3 ; -1.35,1.3 -0.85,1.3 ; -0.85,-1.8 -0.85,-1.3 ; -0.85,-0.8 -0.85,-1.3 ; -0.85,0.8 -0.85,1.3 ; -0.85,1.8 -0.85,1.3 ; -0.5,0 0,0 ; -0.35,-1.3 -0.85,-1.3 ; -0.35,1.3 -0.85,1.3 ; 0,-0.5 0,0 ; 0,0.5 0,0 ; 0.35,-1.3 0.85,-1.3 ; 0.35,1.3 0.85,1.3 ; 0.5,0 0,0 ; 0.85,-1.8 0.85,-1.3 ; 0.85,-0.8 0.85,-1.3 ; 0.85,0.8 0.85,1.3 ; 0.85,1.8 0.85,1.3 ; 1.35,-1.3 0.85,-1.3 ; 1.35,1.3 0.85,1.3
Mechanical 14:
  circle w0.1: c-0.85,1.3 r0.2
  lines w0.1: -1.3,-1.65 -1.3,1.65 1.3,1.65 1.3,-1.65 -1.3,-1.65
Mechanical 15:
  lines w0.05: -1.7,-2.05 -1.7,2.05 1.7,2.05 1.7,-2.05 -1.7,-2.05
3D body "OSC_ABRACON_ASVTX-11.stp": height 1, standoff 0, extent -1.3,-1.65 1.3,1.65

## OSC_CONNOR-WINFIELD_D75 [mm] "SMD TCXO, Side Concave, 10 pins, 5.00x7.00mm, D75 Serie"
height 2
pads (10):
  rect 1.28x0.76 smd: 1(-2.09,1.27) 2(-2.09,0) 3(-2.09,-1.27) 6(2.09,-1.27) 7(2.09,0) 8(2.09,1.27)
  rect 0.94x1.28 smd: 4(-1.27,-3.105) 5(1.27,-3.105) 9(1.27,3.105) 10(-1.27,3.105)
Top Overlay:
  circle w0.25: c-3.125,2.4 r0.125
  lines w0.2: -2.5,-1.95 -2.5,-3.5 -2.04,-3.5 ; -2.5,1.95 -2.5,3.5 -2.04,3.5 ; -2,-2.165 -2,-1.95 ; -2,1.95 -2,2.165 ; -0.5,-3.5 0.5,-3.5 ; -0.5,-2.5 0.5,-2.5 ; -0.5,2.5 0.5,2.5 ; -0.5,3.5 0.5,3.5 ; 1,-2.165 1,2.165 ; 2.04,-3.5 2.5,-3.5 2.5,-1.95 ; 2.04,3.5 2.5,3.5 2.5,1.95
Mechanical 8:
  lines w0.1: -2.59,-1.27 -2.09,-1.27 ; -2.59,0 -2.09,0 ; -2.59,1.27 -2.09,1.27 ; -2.09,-1.77 -2.09,-1.27 ; -2.09,-0.77 -2.09,-1.27 ; -2.09,-0.5 -2.09,0 ; -2.09,0.5 -2.09,0 ; -2.09,0.77 -2.09,1.27 ; -2.09,1.77 -2.09,1.27 ; -1.77,-3.105 -1.27,-3.105 ; -1.77,3.105 -1.27,3.105 ; -1.59,-1.27 -2.09,-1.27 ; -1.59,0 -2.09,0 ; -1.59,1.27 -2.09,1.27 ; -1.27,-3.605 -1.27,-3.105 ; -1.27,-2.605 -1.27,-3.105 ; -1.27,2.605 -1.27,3.105 ; -1.27,3.605 -1.27,3.105 ; -0.77,-3.105 -1.27,-3.105 ; -0.77,3.105 -1.27,3.105 ; -0.5,0 0,0 ; 0,-0.5 0,0 ; 0,0.5 0,0 ; 0.5,0 0,0 ; 0.77,-3.105 1.27,-3.105 ; 0.77,3.105 1.27,3.105 ; 1.27,-3.605 1.27,-3.105 ; 1.27,-2.605 1.27,-3.105 ; 1.27,2.605 1.27,3.105 ; 1.27,3.605 1.27,3.105 ; 1.59,-1.27 2.09,-1.27 ; 1.59,0 2.09,0 ; 1.59,1.27 2.09,1.27 ; 1.77,-3.105 1.27,-3.105 ; 1.77,3.105 1.27,3.105 ; 2.09,-1.77 2.09,-1.27 ; 2.09,-0.77 2.09,-1.27 ; 2.09,-0.5 2.09,0 ; 2.09,0.5 2.09,0 ; 2.09,0.77 2.09,1.27 ; 2.09,1.77 2.09,1.27 ; 2.59,-1.27 2.09,-1.27 ; 2.59,0 2.09,0 ; 2.59,1.27 2.09,1.27 ; -1.74,-3.745 -0.8,-3.745 ; -1.74,-3.745 -1.74,-2.465 ; -1.74,-3.745 -1.74,-2.465 ; -1.74,-3.745 -0.8,-3.745 ; -1.74,-2.465 -1.74,-1.904 -1.196,-1.904 -1.196,2.211 1.196,2.211 1.196,-2.211 0.546,-2.211 0.546,-3.745 -0.8,-3.745 ; -1.74,-2.465 -0.8,-2.465 -0.8,-3.745 ; -2.73,-1.65 -1.45,-1.65 -1.45,-0.89 -2.73,-0.89 -2.73,-1.65 ; -2.73,-0.38 -1.45,-0.38 -1.45,0.38 -2.73,0.38 -2.73,-0.38 ; -2.73,0.89 -1.45,0.89 -1.45,1.65 -2.73,1.65 -2.73,0.89 ; -1.74,2.465 -0.8,2.465 -0.8,3.745 -1.74,3.745 -1.74,2.465 ; 0.8,-3.745 0.8,-2.465 1.74,-2.465 1.74,-3.745 0.8,-3.745 ; 0.8,2.465 1.74,2.465 1.74,3.745 0.8,3.745 0.8,2.465 ; 1.45,-1.65 1.45,-0.89 2.73,-0.89 2.73,-1.65 1.45,-1.65 ; 1.45,-0.38 1.45,0.38 2.73,0.38 2.73,-0.38 1.45,-0.38 ; 1.45,0.89 1.45,1.65 2.73,1.65 2.73,0.89 1.45,0.89
Mechanical 14:
  circle w0.1: c-1.5,2 r0.2
  lines w0.1: 1.556,-3.5 1.651,-3.5 ; 1.65,-1.48 2.2,-1.48 ; 1.65,-0.93 2.2,-0.93 ; 1.65,0.36 2.2,0.36 ; 1.65,0.91 2.2,0.91 ; 1.65,2.2 2.2,2.2 ; 1.651,2.75 2.2,2.75 ; -2.5,-3.5 -2.5,-1.508 ccw(c-2.5,-1.27) -2.5,-1.032 -2.5,-0.238 ccw(c-2.5,0) -2.5,0.238 -2.5,1.032 ccw(c-2.5,1.27) -2.5,1.508 -2.5,3.5 -1.581,3.5 ccw(c-1.27,3.5) -0.959,3.5 0.959,3.5 ccw(c1.27,3.5) 1.581,3.5 2.5,3.5 2.5,1.508 ccw(c2.5,1.27) 2.5,1.032 2.5,0.238 ccw(c2.5,0) 2.5,-0.238 2.5,-1.032 ccw(c2.5,-1.27) 2.5,-1.508 2.5,-3.5 1.581,-3.5 ccw(c1.27,-3.5) 0.959,-3.5 -0.959,-3.5 ccw(c-1.27,-3.5) -1.581,-3.5 -2.5,-3.5 ; -2,-2.3 ccw(c-1.8,-2.3) -1.8,-2.5 0.8,-2.5 ccw(c0.8,-2.3) 1,-2.3 1,2.3 ccw(c0.8,2.3) 0.8,2.5 -1.8,2.5 ccw(c-1.8,2.3) -2,2.3 -2,-2.3 ; 1.65,-1.73 1.65,-0.68 2.2,-0.68 2.2,-1.73 1.65,-1.73 ; 1.65,0.11 1.65,1.16 2.2,1.16 2.2,0.11 1.65,0.11 ; 1.651,1.95 2.2,1.95 2.2,3 1.651,3 1.651,1.95
Mechanical 15:
  lines w0.05: -2.98,-3.995 -2.98,3.995 2.98,3.995 2.98,-3.995 -2.98,-3.995
3D body "OSC_CONNOR-WINFIELD_D75.stp": height 2, standoff 0, extent -2.5,-3.5 2.5,3.5

## OSC_CRYSTEK_CCHD-575 [mm] "Oscillator, 5.08mm Pitch; 4 Pin, 5.08mm L X 7.5mm W X 2.5mm H, CCHD-575 Serie"
height 2.5
pads (4):
  rect 1.8x1.27 smd: 1(-1.955,2.54) 2(-1.955,-2.54) 3(1.955,-2.54) 4(1.955,2.54)
Top Overlay:
  circle w0.25: c-3.525,2.6 r0.125
  lines w0.2: -2.54,-3.475 -2.54,-3.75 2.54,-3.75 2.54,-3.475 ; -2.54,-1.605 -2.54,1.605 ; -2.54,3.475 -2.54,3.75 2.54,3.75 2.54,3.475 ; 2.54,-1.605 2.54,1.605
Mechanical 8:
  lines w0.1: -2.455,-2.54 -1.955,-2.54 ; -2.455,2.54 -1.955,2.54 ; -1.955,-3.04 -1.955,-2.54 ; -1.955,-2.04 -1.955,-2.54 ; -1.955,2.04 -1.955,2.54 ; -1.955,3.04 -1.955,2.54 ; -1.455,-2.54 -1.955,-2.54 ; -1.455,2.54 -1.955,2.54 ; -0.5,0 0,0 ; 0,-0.5 0,0 ; 0,0.5 0,0 ; 0.5,0 0,0 ; 1.455,-2.54 1.955,-2.54 ; 1.455,2.54 1.955,2.54 ; 1.955,-3.04 1.955,-2.54 ; 1.955,-2.04 1.955,-2.54 ; 1.955,2.04 1.955,2.54 ; 1.955,3.04 1.955,2.54 ; 2.455,-2.54 1.955,-2.54 ; 2.455,2.54 1.955,2.54 ; -2.855,-3.175 -2.855,-1.905 -1.055,-1.905 -1.055,-3.175 -2.855,-3.175 ; -2.855,1.905 -2.855,3.175 -1.055,3.175 -1.055,1.905 -2.855,1.905 ; 1.055,-3.175 1.055,-1.905 2.855,-1.905 2.855,-3.175 1.055,-3.175 ; 1.055,1.905 1.055,3.175 2.855,3.175 2.855,1.905 1.055,1.905
Mechanical 14:
  circle w0.1: c-1.555,2.55 r0.4
  lines w0.1: -2.54,-3.75 2.54,-3.75 2.54,3.75 -2.54,3.75 -2.54,-3.75 ; -2.21,-3.42 -2.21,3.42 2.21,3.42 2.21,-3.42 -2.21,-3.42
Mechanical 15:
  lines w0.05: -3.105,-4 3.105,-4 3.105,4 -3.105,4 -3.105,-4
3D body "OSC_CRYSTEK_CCHD-575.stp": height 2.5, standoff 0, extent -2.54,-3.75 2.54,3.75